# Altium footprint library MyPcbLib.PcbLib: 657 footprints (part 40 of 42)
Each footprint in its own frame and in the unit in brackets; x right, y up, seen from the top. Pads: shape width x height; smd on the part's side, far side on the other; paste and mask are expansions set on the pad; w line width, h text height; cw(c..) or ccw(c..) is an arc to the next point about the centre after c.
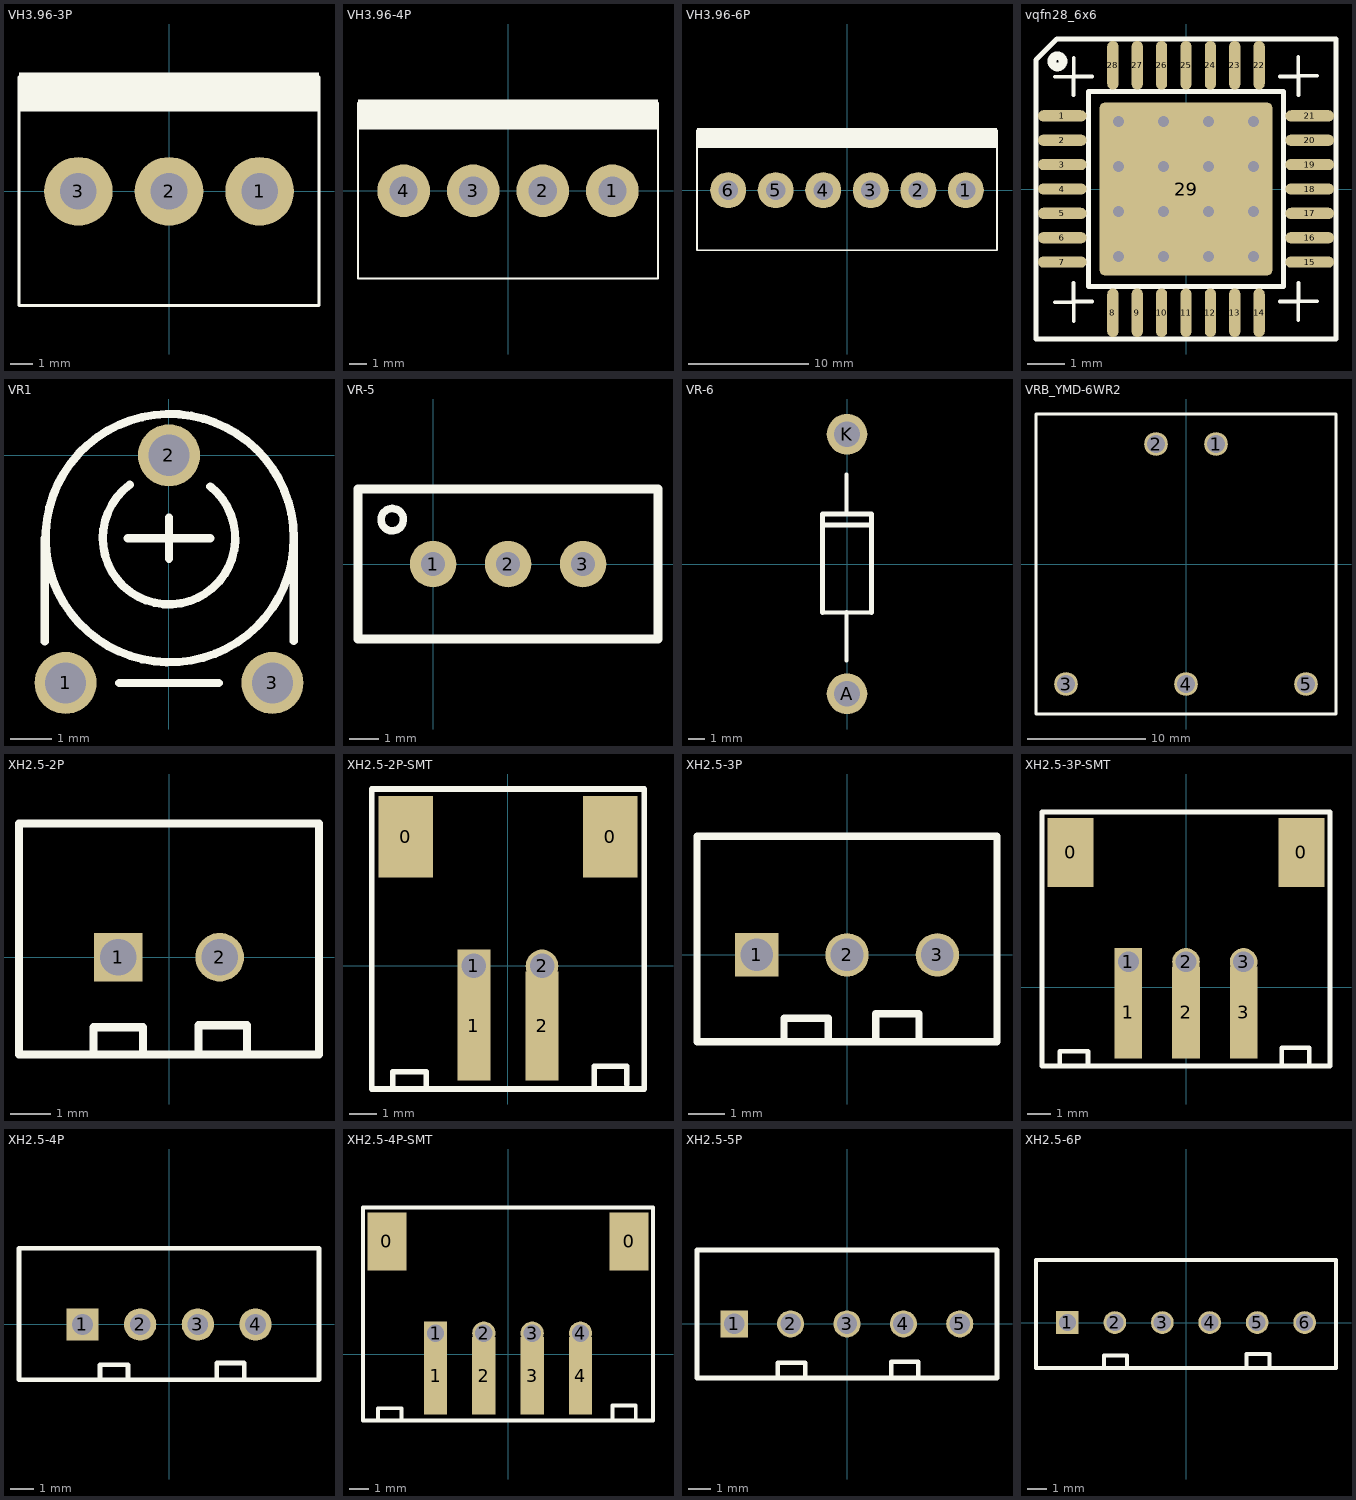
[diagram p39: the footprints below, top view; thin cyan lines are the x and y axes]

## VH3.96-3P [mm]
pads (3):
  round 3 hole 1.6: 1(3.96,0) 2(0,0) 3(-3.96,0)
Top Overlay:
  rectangle: -6.56,3.5 6.56,5.2
  lines w0.127: -6.56,5 -6.56,-5 6.56,-5 6.56,5

## VH3.96-4P [mm]
pads (4):
  round 3 hole 1.6: 1(5.94,0) 2(1.98,0) 3(-1.98,0) 4(-5.94,0)
Top Overlay:
  rectangle: -8.54,3.5 8.54,5.2
  lines w0.127: -8.54,5 -8.54,-5 8.54,-5 8.54,5

## VH3.96-6P [mm]
pads (6):
  round 3 hole 1.6: 1(9.9,0) 2(5.94,0) 3(1.98,0) 4(-1.98,0) 5(-5.94,0) 6(-9.9,0)
Top Overlay:
  rectangle: -12.5,3.5 12.5,5.2
  lines w0.127: -12.5,5 -12.5,-5 12.5,-5 12.5,5

## vqfn28_6x6 [mm] "28 Leads, Body 6.0x6.0mm, Pitch 0.65mm, VQFN28"
height 1
pads (29):
  oval 1.3x0.3 smd mask+0.05: 1(-3.3,1.95) 2(-3.3,1.3) 3(-3.3,0.65) 4(-3.3,0) 5(-3.3,-0.65) 6(-3.3,-1.3) 7(-3.3,-1.95) 15(3.3,-1.95) 16(3.3,-1.3) 17(3.3,-0.65) 18(3.3,0) 19(3.3,0.65) 20(3.3,1.3) 21(3.3,1.95)
  oval 0.3x1.3 smd mask+0.05: 8(-1.95,-3.3) 9(-1.3,-3.3) 10(-0.65,-3.3) 11(0,-3.3) 12(0.65,-3.3) 13(1.3,-3.3) 14(1.95,-3.3) 22(1.95,3.3) 23(1.3,3.3) 24(0.65,3.3) 25(0,3.3) 26(-0.65,3.3) 27(-1.3,3.3) 28(-1.95,3.3)
  rrect5% 4.6x4.6 smd paste-3.3 mask+0.05: 29(0,0)
via 0.6,-1.8 diameter 0.6 hole 0.3
via 1.8,-0.6 diameter 0.6 hole 0.3
via -1.8,1.8 diameter 0.6 hole 0.3
via -1.8,-0.6 diameter 0.6 hole 0.3
via -1.8,0.6 diameter 0.6 hole 0.3
via 0.6,-0.6 diameter 0.6 hole 0.3
via 1.8,-1.8 diameter 0.6 hole 0.3
via -0.6,-1.8 diameter 0.6 hole 0.3
via -1.8,-1.8 diameter 0.6 hole 0.3
via -0.6,1.8 diameter 0.6 hole 0.3
via -0.6,0.6 diameter 0.6 hole 0.3
via -0.6,-0.6 diameter 0.6 hole 0.3
via 0.6,0.6 diameter 0.6 hole 0.3
via 0.6,1.8 diameter 0.6 hole 0.3
via 1.8,1.8 diameter 0.6 hole 0.3
via 1.8,0.6 diameter 0.6 hole 0.3
Top Overlay:
  circle w0.23: c-3.429,3.404 r0.15
  lines w0.1: -3.494,-3.02 -2.994,-3.02 -2.994,-3.52 ; -3.494,2.994 -2.994,2.994 -2.994,3.494 ; -3,-2.5 -3,-3 -2.5,-3 ; -3,2.5 -3,3 -2.5,3 ; 2.5,-3 3,-3 3,-2.5 ; 2.5,3 3,3 3,2.5 ; 2.994,-3.494 2.994,-2.994 3.494,-2.994 ; 2.994,3.52 2.994,3.02 3.494,3.02
  lines w0.127: -4,-4 4,-4 4,4 -3.442,4 -4,3.442 -4,-4 ; -2.6,-2.6 2.6,-2.6 2.6,2.6 -2.6,2.6 -2.6,-2.6
Top Paste:
  region: -1.6,-0.8 -1.6,-1.6 -0.8,-1.6 -0.8,-0.8
  region: 0.8,-0.8 0.8,-1.6 1.6,-1.6 1.6,-0.8
  region: -0.4,-0.8 -0.4,-1.6 0.4,-1.6 0.4,-0.8
  region: 0.8,0.4 0.8,-0.4 1.6,-0.4 1.6,0.4
  region: -1.6,1.6 -1.6,0.8 -0.8,0.8 -0.8,1.6
  region: -0.4,1.6 -0.4,0.8 0.4,0.8 0.4,1.6
  region: -1.6,0.4 -1.6,-0.4 -0.8,-0.4 -0.8,0.4
  region: -0.4,0.4 -0.4,-0.4 0.4,-0.4 0.4,0.4
  region: 0.8,1.6 0.8,0.8 1.6,0.8 1.6,1.6

## VR1 [mm]
pads (3):
  round 1.5 hole 1: 1(-2.5,-5.5) 2(0,0) 3(2.5,-5.5)
Top Overlay:
  circle w0.2: c0.016,-2 r3
  lines w0.2: -3,-4.5 -3,-2 ; -1.2,-5.5 1.2,-5.5 ; -1,-2 1,-2 ; -0.948,-0.71 ccw(c0,-2) 1,-0.75 ; 0,-2.5 0,-1.5 ; 3,-5.5 3.016,-5.484 ; 3.016,-4.484 3.016,-2

## VR-5 [mil]
pads (3):
  round 62 hole 32: 1(0,0) 2(100,0) 3(200,0)
Top Overlay:
  lines w10: -40,55 cw(c-54.35,59.1) -39.52,57.45
  lines w12: -100,-100 300,-100 300,0 300,100 -100,100 -100,-100

## VR-6 [mm] "10A10"
pads (2):
  round 2.5 hole 1.6: A(0,-8) K(0,8)
Top Overlay:
  lines w0.254: -1.5,-3 1.5,-3 ; -0.025,-5.944 -0.025,-2.972 ; -0.025,3.175 -0.025,5.512
  lines w0.305: -1.5,-3 -1.5,3.092 1.5,3.092 1.5,-3 ; -1.448,2.413 1.473,2.413

## VRB_YMD-6WR2 [mm]
pads (5):
  round 2 hole 1.5: 1(2.54,10.16) 2(-2.54,10.16) 3(-10.16,-10.16) 4(0,-10.16) 5(10.16,-10.16)
Top Overlay:
  lines w0.254: -12.7,-12.7 -12.7,12.7 12.7,12.7 12.7,-12.7 -12.7,-12.7

## XH2.5-2P [mm]
pads (2):
  rect 1.2x1.2 hole 0.9: 1(-1.25,0)
  round 1.2 hole 0.9: 2(1.25,0)
Top Overlay:
  lines w0.203: -3.7,-2.4 3.7,-2.4 ; -3.7,-2.362 -3.7,3.3 3.7,3.3 3.7,-2.337 ; -1.863,-2.311 -1.863,-1.727 -0.644,-1.727 -0.644,-2.286 ; 0.727,-2.388 0.727,-1.676 1.921,-1.676 1.921,-2.337
3D body: height 2.01, standoff -8.91, extent -3.696,-2.311 3.696,3.429

## XH2.5-2P-SMT [mm]
pads (6):
  rect 2x3 smd: 0(-3.759,4.75) 0(3.759,4.75)
  rect 1.2x4 smd: 1(-1.25,-2.2) 2(1.25,-2.2)
  rect 1.2x1.2 hole 0.9: 1(-1.25,0)
  round 1.2 hole 0.9: 2(1.25,0)
Top Overlay:
  lines w0.203: -4.226,-4.47 -4.226,-3.886 -3.006,-3.886 -3.006,-4.445 ; 3.166,-4.394 3.166,-3.683 4.36,-3.683 4.36,-4.343 ; -5,-4.521 5,-4.521 5,6.5 -5,6.5 -5,-4.521

## XH2.5-3P [mm]
pads (3):
  rect 1.2x1.2 hole 0.9: 1(-2.5,0)
  round 1.2 hole 0.9: 2(0,0) 3(2.5,0)
Top Overlay:
  lines w0.203: -4.15,-2.4 4.15,-2.4 ; -4.15,-2.362 -4.15,3.277 4.15,3.277 4.15,-2.337 ; -1.742,-2.337 -1.742,-1.753 -0.523,-1.753 -0.523,-2.311 ; 0.798,-2.337 0.798,-1.626 1.992,-1.626 1.992,-2.286

## XH2.5-3P-SMT [mm]
pads (8):
  rect 2x3 smd: 0(-5.009,5.85) 0(5.009,5.85)
  rect 1.2x4 smd: 1(-2.5,-1.1) 2(0,-1.1) 3(2.5,-1.1)
  rect 1.2x1.2 hole 0.9: 1(-2.5,1.1)
  round 1.2 hole 0.9: 2(0,1.1) 3(2.5,1.1)
Top Overlay:
  lines w0.203: -5.476,-3.37 -5.476,-2.786 -4.256,-2.786 -4.256,-3.345 ; 4.151,-3.345 4.151,-2.634 5.345,-2.634 5.345,-3.294 ; -6.25,-3.421 6.25,-3.421 6.25,7.6 -6.25,7.6 -6.25,-3.421

## XH2.5-4P [mm]
pads (4):
  rect 1.4x1.4 hole 0.9: 1(-3.75,0)
  round 1.4 hole 0.9: 2(-1.25,0) 3(1.25,0) 4(3.75,0)
Top Overlay:
  lines w0.203: -6.5,-2.4 6.5,-2.4 ; -6.5,-2.362 -6.5,3.302 6.5,3.302 6.5,-2.337 ; -2.992,-2.337 -2.992,-1.753 -1.773,-1.753 -1.773,-2.311 ; 2.063,-2.388 2.063,-1.676 3.257,-1.676 3.257,-2.337

## XH2.5-4P-SMT [mm]
pads (10):
  rect 2x3 smd: 0(-6.259,5.85) 0(6.259,5.85)
  rect 1.2x4 smd: 1(-3.75,-1.1) 2(-1.25,-1.1) 3(1.25,-1.1) 4(3.75,-1.1)
  rect 1.2x1.2 hole 0.9: 1(-3.75,1.1)
  round 1.2 hole 0.9: 2(-1.25,1.1) 3(1.25,1.1) 4(3.75,1.1)
Top Overlay:
  lines w0.203: -6.726,-3.37 -6.726,-2.786 -5.506,-2.786 -5.506,-3.345 ; 5.416,-3.345 5.416,-2.634 6.609,-2.634 6.609,-3.294 ; -7.5,-3.421 7.5,-3.421 7.5,7.6 -7.5,7.6 -7.5,-3.421

## XH2.5-5P [mm]
pads (5):
  rect 1.2x1.2 hole 0.9: 1(-5,0)
  round 1.2 hole 0.9: 2(-2.5,0) 3(0,0) 4(2.5,0) 5(5,0)
Top Overlay:
  lines w0.203: -6.65,-2.4 6.65,-2.4 ; -6.65,-2.362 -6.65,3.277 6.65,3.277 6.65,-2.337 ; -3.073,-2.311 -3.073,-1.727 -1.854,-1.727 -1.854,-2.286 ; 1.956,-2.388 1.956,-1.676 3.15,-1.676 3.15,-2.337

## XH2.5-6P [mm]
pads (6):
  rect 1.2x1.2 hole 0.9: 1(-6.25,0)
  round 1.2 hole 0.9: 2(-3.75,0) 3(-1.25,0) 4(1.25,0) 5(3.75,0) 6(6.25,0)
Top Overlay:
  lines w0.203: -7.9,-2.4 7.9,-2.4 ; -7.9,-2.362 -7.9,3.302 7.9,3.302 7.9,-2.337 ; -4.323,-2.311 -4.323,-1.727 -3.104,-1.727 -3.104,-2.286 ; 3.195,-2.362 3.195,-1.651 4.389,-1.651 4.389,-2.311